# Altium footprint library Master_v1i3.PcbLib: 21 footprints (part 2 of 2)
Each footprint in its own frame and in the unit in brackets; x right, y up, seen from the top. Pads: shape width x height; smd on the part's side, far side on the other; paste and mask are expansions set on the pad; w line width, h text height; cw(c..) or ccw(c..) is an arc to the next point about the centre after c.
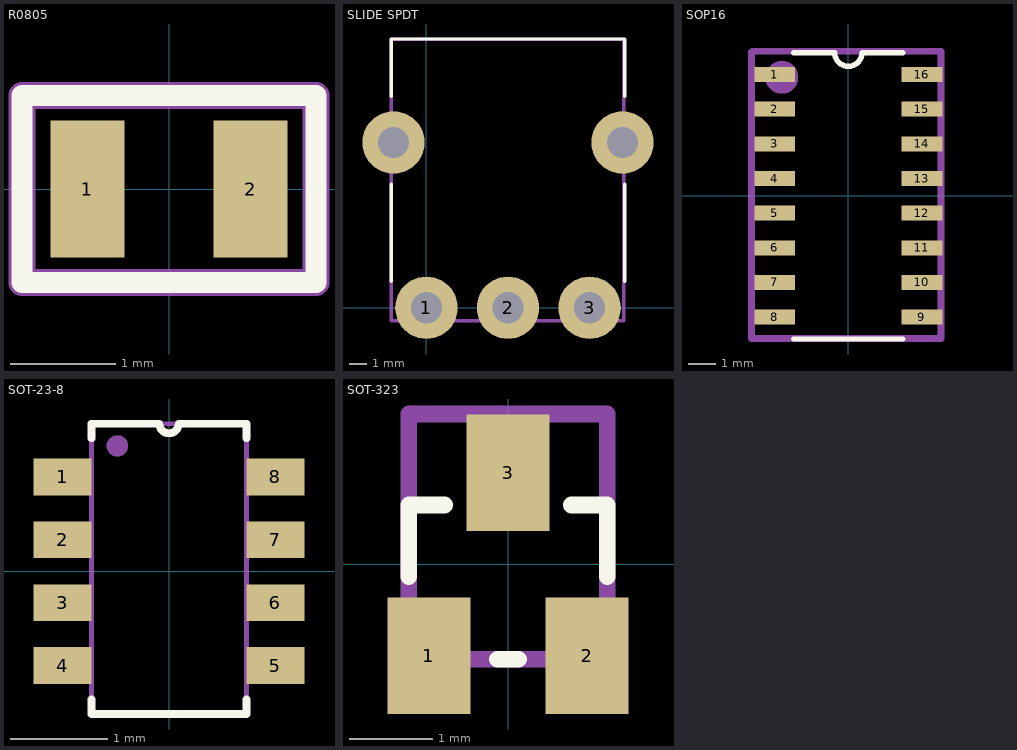
[diagram p1: the footprints below, top view; thin cyan lines are the x and y axes]

## R0805 [mm]
pads (2):
  rect 0.7x1.3 smd: 1(-0.775,0) 2(0.775,0)
Top Overlay:
  lines w0.2: -1.397,-0.889 1.397,-0.889 1.397,0.889 -1.397,0.889 -1.397,-0.889
Mechanical 29:
  lines w0.254: -1.397,-0.889 1.397,-0.889 1.397,0.889 -1.397,0.889 -1.397,-0.889
  text "'.Designator'" at -0.889,-0.254 h0.51
3D body "RES_2013-0805.step": height 0.77, standoff 0.01, extent -1.15,-0.675 1.15,0.675

## SLIDE SPDT [mm] "500SSP1S1M6QEA"
pads (5):
  round 3.6 hole 1.8: 1(0,0) 2(4.7,0) 3(9.4,0) ""(-1.9,9.53) ""(11.3,9.53)
Top Overlay:
  lines w0.2: -2.032,1.524 -2.032,7.112 ; -2.032,12.192 -2.032,15.494 11.43,15.494 11.43,12.192 ; 11.43,1.524 11.43,7.112
Mechanical 29:
  lines w0.2: -2.032,15.358 -2.032,-0.754 11.379,-0.754 11.379,15.486 -2.032,15.486
  text "'.Designator'" at 5.462,3.495 h2
3D body "1101M2S3ABE2.step": height 6.6, standoff -3.17, extent -2.032,-0.754 11.379,15.486

## SOP16 [mm]
pads (16):
  rect 1.5x0.55 smd: 1(-2.7,4.445) 2(-2.7,3.175) 3(-2.7,1.905) 4(-2.7,0.635) 5(-2.7,-0.635) 6(-2.7,-1.905) 7(-2.7,-3.175) 8(-2.7,-4.445) 9(2.7,-4.445) 10(2.7,-3.175) 11(2.7,-1.905) 12(2.7,-0.635) 13(2.7,0.635) 14(2.7,1.905) 15(2.7,3.175) 16(2.7,4.445)
Top Overlay:
  lines w0.2: -2,-5.25 2,-5.25 ; -2,5.25 -0.5,5.25 ccw(c0,5.25) 0,4.75 ccw(c0,5.25) 0.5,5.25 2,5.25
Mechanical 29:
  circle w1: c-2.438,4.343 r0.1
  lines w0.254: -3.55,-5.225 -3.55,5.275 -3.525,5.3 3.4,5.3 3.4,-5.225 -3.55,-5.225 ; -3.55,-5.225 -3.55,-5.225
  text "'.Designator'" at 0.3,-1.275 h1
3D body "SOIC-16-3.step": height 1.71, standoff 0.01, extent -3.099,-4.95 3.099,4.956

## SOT-23-8 [mm]
pads (8):
  rect 0.6x0.38 smd mask+0.05: 1(-1.1,0.975) 2(-1.1,0.325) 3(-1.1,-0.325) 4(-1.1,-0.975) 5(1.1,-0.975) 6(1.1,-0.325) 7(1.1,0.325) 8(1.1,0.975)
Top Overlay:
  lines w0.08: -0.8,-1.325 -0.8,-1.475 0.8,-1.475 0.8,-1.325 ; -0.8,1.375 -0.8,1.525 -0.15,1.525 -0.1,1.525 ccw(c0,1.525) 0.1,1.525 0.8,1.525 0.8,1.375
Mechanical 29:
  circle w0.2: c-0.533,1.295 r0.01
  lines w0.05: -0.8,-1.475 -0.8,1.525 0.8,1.525 0.8,-1.475 -0.8,-1.475
  text "'.Designator'" at 0.2,-0.625 h0.4
3D body "TSOT-23-8.STEP": height 1.01, standoff 0.01, extent -1.4,-1.45 1.4,1.45

## SOT-323 [mm]
pads (3):
  rect 1x1.4 smd: 1(-0.95,-1.1) 2(0.95,-1.1) 3(0,1.1)
Top Overlay:
  lines w0.2: -1.194,-0.152 -1.194,0.711 -0.762,0.711 ; -0.127,-1.143 0.127,-1.143 ; 0.762,0.711 1.194,0.711 1.194,-0.152
Mechanical 29:
  lines w0.2: -1.194,-1.143 1.194,-1.143 1.194,1.803 -1.194,1.803 -1.194,-1.143
  text "'.Designator'" at -0.635,-0.127 h0.5
3D body "sot-323.step": height 1, standoff 0, extent -1.05,-1.15 1.05,1.15